# Altium footprint library OT Library.PcbLib: 396 footprints (part 6 of 25)
Each footprint in its own frame and in the unit in brackets; x right, y up, seen from the top. Pads: shape width x height; smd on the part's side, far side on the other; paste and mask are expansions set on the pad; w line width, h text height; cw(c..) or ccw(c..) is an arc to the next point about the centre after c.
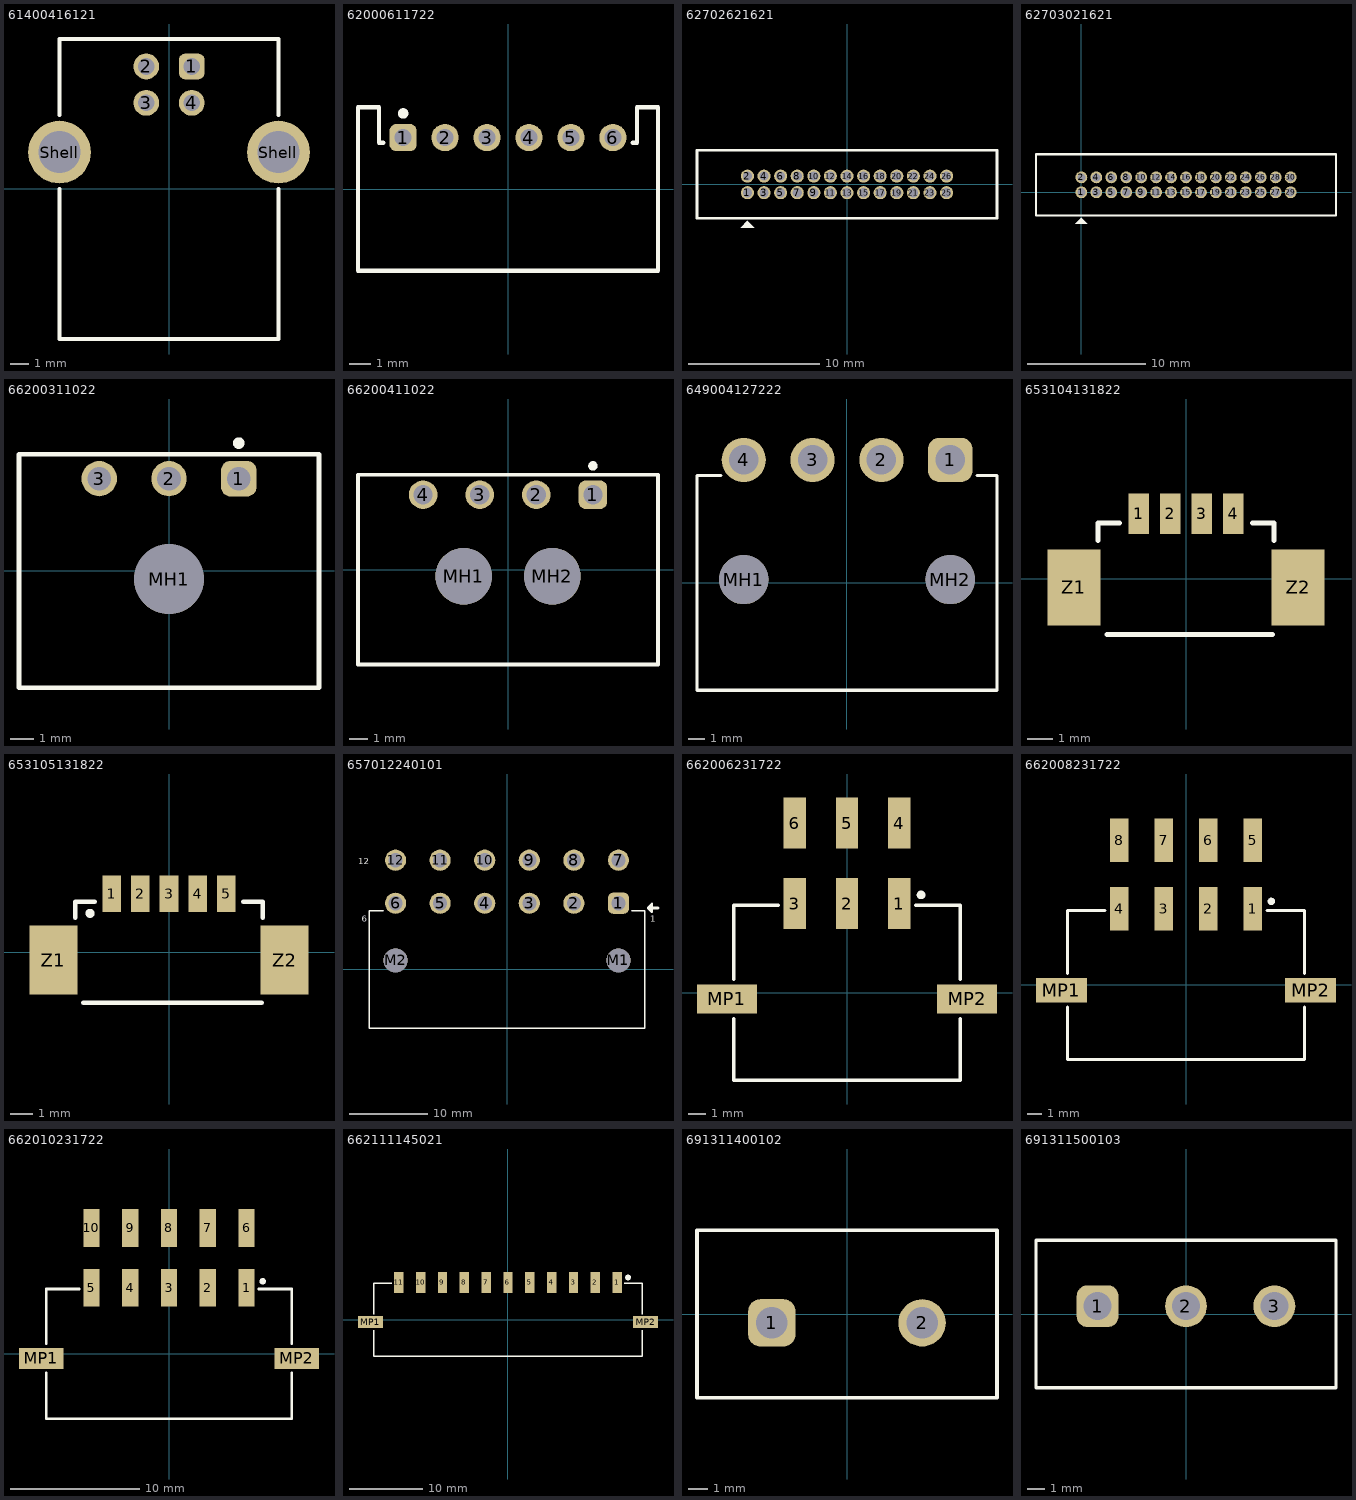
[diagram p5: the footprints below, top view; thin cyan lines are the x and y axes]

## 61400416121 [mm] "USB 2.0 Type B Horizontal"
height 11.05
pads (6):
  rrect50% 1.42x1.42 hole 0.92: 1(1.25,6.74)
  round 1.42 hole 0.92: 2(-1.25,6.74) 3(-1.25,4.74) 4(1.25,4.74)
  round 3.45 hole 2.3: Shell(-6.02,2.03) Shell(6.02,2.03)
Top Overlay:
  lines w0.2: -6.02,0 -6.02,-8.25 6.02,-8.25 6.02,0 ; -6.02,4.06 -6.02,8.25 6.02,8.25 6.02,4.06
3D body: height 11.15, standoff -3.71, extent -7.484,-8.25 7.484,8.25

## 62000611722 [mm] "2.00mm Male Horizontal Shrouded Header, 6p"
height 4.5
pads (6):
  rrect50% 1.3x1.3 hole 0.8: 1(-5,2.45)
  round 1.3 hole 0.8: 2(-3,2.45) 3(-1,2.45) 4(1,2.45) 5(3,2.45) 6(5,2.45)
Top Overlay:
  circle w0.25: c-5,3.6 r0.125
  lines w0.2: -5.95,2.2 -6.15,2.2 -6.15,3.9 -7.15,3.9 -7.15,-3.9 7.15,-3.9 7.15,3.9 6.15,3.9 6.15,2.2 5.95,2.2
3D body: height 4.83, standoff -3.27, extent -7,-3.8 7,3.8

## 62702621621 [mm] "1.27x1.27mm Pitch Box Header Straight Type, 26p"
height 4.9
pads (26):
  round 1 hole 0.7: 1(-7.62,-0.635) 2(-7.62,0.635) 3(-6.35,-0.635) 4(-6.35,0.635) 5(-5.08,-0.635) 6(-5.08,0.635) 7(-3.81,-0.635) 8(-3.81,0.635) 9(-2.54,-0.635) 10(-2.54,0.635) 11(-1.27,-0.635) 12(-1.27,0.635) 13(0,-0.635) 14(0,0.635) 15(1.27,-0.635) 16(1.27,0.635) 17(2.54,-0.635) 18(2.54,0.635) 19(3.81,-0.635) 20(3.81,0.635) 21(5.08,-0.635) 22(5.08,0.635) 23(6.35,-0.635) 24(6.35,0.635) 25(7.62,-0.635) 26(7.62,0.635)
Top Overlay:
  region: -8.128,-3.302 -7.62,-2.794 -7.112,-3.302
  lines w0.2: -11.48,-2.6 11.48,-2.6 11.48,2.6 -11.48,2.6 -11.48,-2.6
3D body: height 4.93, standoff -2.37, extent -11.43,-2.55 11.43,2.5

## 62703021621 [mm] "1.27x1.27mm Pitch Box Header Straight Type, 30p"
height 4.9
pads (30):
  round 1 hole 0.7: 1(0,0) 2(0,1.27) 3(1.27,0) 4(1.27,1.27) 5(2.54,0) 6(2.54,1.27) 7(3.81,0) 8(3.81,1.27) 9(5.08,0) 10(5.08,1.27) 11(6.35,0) 12(6.35,1.27) 13(7.62,0) 14(7.62,1.27) 15(8.89,0) 16(8.89,1.27) 17(10.16,0) 18(10.16,1.27) 19(11.43,0) 20(11.43,1.27) 21(12.7,0) 22(12.7,1.27) 23(13.97,0) 24(13.97,1.27) 25(15.24,0) 26(15.24,1.27) 27(16.51,0) 28(16.51,1.27) 29(17.78,0) 30(17.78,1.27)
Top Overlay:
  region: -0.508,-2.667 0,-2.159 0.508,-2.667
  lines w0.2: -3.86,-1.965 -3.86,3.235 21.64,3.235 21.64,-1.965 -3.86,-1.965
3D body: height 4.93, standoff -2.37, extent -3.81,-1.915 21.59,3.135

## 66200311022 [mm] "3.00mm Male Single Row Angled Header with Plastic Pegs, 3p"
height 5.07
pads (4):
  rrect50% 1.52x1.52 hole 1.02: 1(3,3.97)
  round 1.52 hole 1.02: 2(0,3.97) 3(-3,3.97)
  round 3 hole 3 unplated: MH1(0,-0.35)
Top Overlay:
  circle w0.25: c3,5.5 r0.125
  lines w0.2: -6.45,-5.025 -6.45,5.025 6.45,5.025 6.45,-5.025 -6.45,-5.025
3D body: height 5.6, standoff -3.16, extent -6.325,-4.95 6.325,4.95

## 66200411022 [mm] "3.00mm Male Single Row Angled Header with Plastic Pegs, 4p"
height 5.07
pads (6):
  rrect50% 1.52x1.52 hole 1.02: 1(4.5,3.97)
  round 1.52 hole 1.02: 2(1.5,3.97) 3(-1.5,3.97) 4(-4.5,3.97)
  round 3 hole 3 unplated: MH1(-2.35,-0.35) MH2(2.35,-0.35)
Top Overlay:
  circle w0.25: c4.5,5.5 r0.125
  lines w0.2: -7.95,-5.025 -7.95,5.025 7.95,5.025 7.95,-5.025 -7.95,-5.025
3D body: height 5.6, standoff -3.16, extent -7.825,-4.95 7.825,4.95

## 649004127222 [mm] "4.20mm Male Single Row Angled Header with Mounting Pegs, 4p"
height 5.8
pads (6):
  rrect50% 2.7x2.7 hole 1.8: 1(6.3,7.5)
  round 2.7 hole 1.8: 2(2.1,7.5) 3(-2.1,7.5) 4(-6.3,7.5)
  round 3 hole 3 unplated: MH1(-6.3,0.2) MH2(6.3,0.2)
Top Overlay:
  lines w0.2: -7.7,6.55 -9.15,6.55 -9.15,-6.55 9.15,-6.55 9.15,6.55 7.95,6.55
3D body: height 7.23, standoff -3.47, extent -9,-6.4 9,8.07

## 653104131822 [mm]
pads (6):
  rect 0.81x1.6 smd: 1(-1.875,2.56) 2(-0.625,2.56) 3(0.625,2.56) 4(1.875,2.56)
  rect 2.1x3 smd: Z1(-4.425,-0.34) Z2(4.425,-0.34)
Top Overlay:
  lines w0.2: -3.475,1.5 -3.475,2.2 -2.625,2.2 ; -3.125,-2.2 3.425,-2.2 ; 2.625,2.2 3.475,2.2 3.475,1.5
3D body: height 3.4, standoff -0.01, extent -4.875,-2.1 4.875,3.31

## 653105131822 [mm]
pads (7):
  rect 0.81x1.6 smd: 1(-2.5,2.56) 2(-1.25,2.56) 3(0,2.56) 4(1.25,2.56) 5(2.5,2.56)
  rect 2.1x3 smd: Z1(-5.05,-0.34) Z2(5.05,-0.34)
Top Overlay:
  circle w0.2: c-3.45,1.7 r0.1
  lines w0.2: -4.1,1.5 -4.1,2.2 -3.25,2.2 ; -3.75,-2.2 4.05,-2.2 ; 3.25,2.2 4.1,2.2 4.1,1.5
3D body: height 3.4, standoff -0.01, extent -5.5,-2.1 5.5,3.31

## 657012240101 [mm] "Dual Row Male Header Right Angled, GW, THT, 12p"
height 14.53
pads (14):
  rrect50% 2.7x2.7 hole 1.8: 1(14.25,8.47)
  round 2.7 hole 1.8: 2(8.55,8.47) 3(2.85,8.47) 4(-2.85,8.47) 5(-8.55,8.47) 6(-14.25,8.47) 7(14.25,13.97) 8(8.55,13.97) 9(2.85,13.97) 10(-2.85,13.97) 11(-8.55,13.97) 12(-14.25,13.97)
  round 3.05 hole 3.05 unplated: M1(14.25,1.17) M2(-14.25,1.17)
Top Overlay:
  lines w0.2: -15.8,7.525 -17.625,7.525 -17.625,-7.525 17.625,-7.525 17.625,7.525 15.95,7.525
  lines w0.3: 18.542,7.874 18.034,7.874 ; 18.034,7.874 18.542,8.382 18.542,7.366 18.034,7.874
  lines w0.4: 18.542,7.874 19.304,7.874
  text "12" at -19.05,13.462 h0.8
  text "6" at -18.542,6.096 h0.8
  text "1" at 18.288,6.096 h0.8
3D body: height 14.69, standoff -3.44, extent -17.425,-7.4 17.425,14.54

## 662006231722 [mm] "3.00mm SMT Male Dual Row Angled Header with SMT Solder Tab, 6p"
height 8.26
pads (8):
  rect 1.27x2.92 smd: 1(3,5.13) 2(0,5.13) 3(-3,5.13) 4(3,9.75) 5(0,9.75) 6(-3,9.75)
  rect 3.43x1.65 smd: MP1(-6.895,-0.35) MP2(6.895,-0.35)
Top Overlay:
  circle w0.25: c4.25,5.625 r0.125
  lines w0.2: -6.5,-1.475 -6.5,-5.025 6.5,-5.025 6.5,-1.475 ; -6.5,0.775 -6.5,5.025 -3.95,5.025 ; 3.95,5.025 6.5,5.025 6.5,0.775
3D body: height 8.79, standoff 0.03, extent -8.05,-4.95 8.05,10.95

## 662008231722 [mm] "3.00mm SMT Male Dual Row Angled Header with SMT Solder Tab, 8p"
height 8.26
pads (10):
  rect 1.27x2.92 smd: 1(4.5,5.13) 2(1.5,5.13) 3(-1.5,5.13) 4(-4.5,5.13) 5(4.5,9.75) 6(1.5,9.75) 7(-1.5,9.75) 8(-4.5,9.75)
  rect 3.43x1.65 smd: MP1(-8.395,-0.35) MP2(8.395,-0.35)
Top Overlay:
  circle w0.25: c5.75,5.625 r0.125
  lines w0.2: -8,-1.475 -8,-5.025 8,-5.025 8,-1.475 ; -8,0.775 -8,5.025 -5.45,5.025 ; 5.45,5.025 8,5.025 8,0.775
3D body: height 8.79, standoff 0.03, extent -9.55,-4.95 9.55,10.95

## 662010231722 [mm] "3.00mm SMT Male Dual Row Angled Header with SMT Solder Tab, 10p"
height 8.26
pads (12):
  rect 1.27x2.92 smd: 1(6,5.13) 2(3,5.13) 3(0,5.13) 4(-3,5.13) 5(-6,5.13) 6(6,9.75) 7(3,9.75) 8(0,9.75) 9(-3,9.75) 10(-6,9.75)
  rect 3.43x1.65 smd: MP1(-9.895,-0.35) MP2(9.895,-0.35)
Top Overlay:
  circle w0.25: c7.25,5.625 r0.125
  lines w0.2: -9.5,-1.475 -9.5,-5.025 9.5,-5.025 9.5,-1.475 ; -9.5,0.775 -9.5,5.025 -6.95,5.025 ; 6.95,5.025 9.5,5.025 9.5,0.775
3D body: height 8.79, standoff 0.03, extent -11.05,-4.95 11.05,10.95

## 662111145021 [mm] "3.00mm Male Single Row Angled Header, 11p"
height 5.57
pads (13):
  rect 1.27x2.92 smd: 1(15,5.12) 2(12,5.12) 3(9,5.12) 4(6,5.12) 5(3,5.12) 6(0,5.12) 7(-3,5.12) 8(-6,5.12) 9(-9,5.12) 10(-12,5.12) 11(-15,5.12)
  rect 3.43x1.65 smd: MP1(-18.895,-0.35) MP2(18.895,-0.35)
Top Overlay:
  circle w0.4: c16.5,5.8 r0.2
  lines w0.2: -18.45,-1.475 -18.45,-5.025 18.45,-5.025 18.45,-1.475 ; -18.45,0.775 -18.45,5.025 -15.95,5.025 ; 15.95,5.025 18.45,5.025 18.45,0.775
3D body: height 5.61, standoff -0.03, extent -20.323,-4.95 20.323,6.403

## 691311400102 [mm] "7.62 mm - Closed Vertical PCB Header - 2p"
height 12
pads (2):
  rrect50% 2.4x2.4 hole 1.6: 1(-3.81,-0.45)
  round 2.4 hole 1.6: 2(3.81,-0.45)
Top Overlay:
  lines w0.2: -7.61,-4.25 -7.61,4.25 7.61,4.25 7.61,-4.25 -7.61,-4.25
3D body: height 12.05, standoff -3.95, extent -7.62,-4.26 7.62,4.24

## 691311500103 [mm] "5,08mm - PCB Headers - Vertical - Closed ends -03p"
height 12
pads (3):
  rrect50% 2.4x2.4 hole 1.6: 1(-5.08,0.45)
  round 2.4 hole 1.6: 2(0,0.45) 3(5.08,0.45)
Top Overlay:
  lines w0.2: -8.62,-4.25 -8.62,4.25 8.62,4.25 8.62,-4.25 -8.62,-4.25
3D body: height 12.05, standoff -3.95, extent -8.62,-4.25 8.62,4.25